# Altium footprint library 全库.PcbLib: 967 footprints (part 59 of 61)
Each footprint in its own frame and in the unit in brackets; x right, y up, seen from the top. Pads: shape width x height; smd on the part's side, far side on the other; paste and mask are expansions set on the pad; w line width, h text height; cw(c..) or ccw(c..) is an arc to the next point about the centre after c.
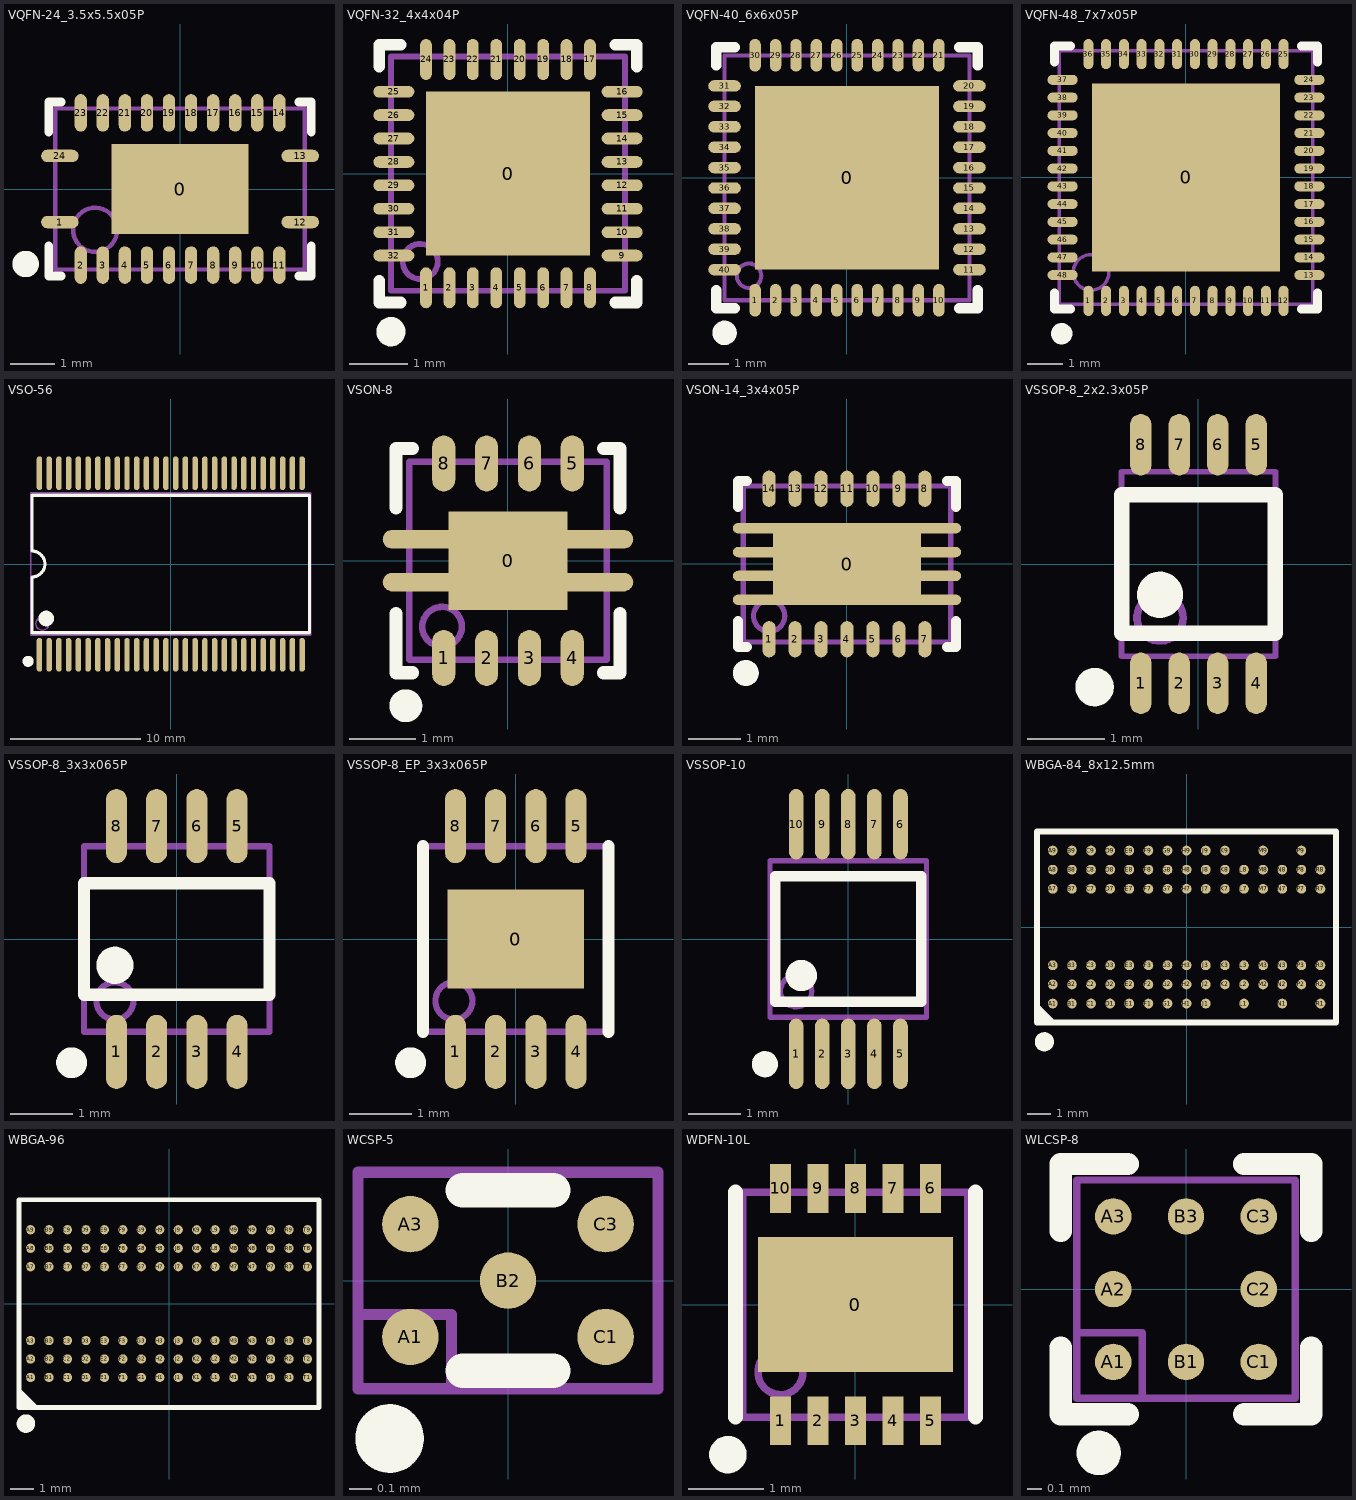
[diagram p58: the footprints below, top view; thin cyan lines are the x and y axes]

## VQFN-24_3.5x5.5x05P [mm]
pads (25):
  rect 3.1x2.05 smd paste-1.025 mask+0.051: 0(0,0)
  oval 0.85x0.28 smd paste-0.025 mask+0.051: 1(-2.725,-0.75) 12(2.725,-0.75) 13(2.725,0.75) 24(-2.725,0.75)
  oval 0.28x0.85 smd paste-0.025 mask+0.051: 2(-2.25,-1.725) 3(-1.75,-1.725) 4(-1.25,-1.725) 5(-0.75,-1.725) 6(-0.25,-1.725) 7(0.25,-1.725) 8(0.75,-1.725) 9(1.25,-1.725) 10(1.75,-1.725) 11(2.25,-1.725) 14(2.25,1.725) 15(1.75,1.725) 16(1.25,1.725) 17(0.75,1.725) 18(0.25,1.725) 19(-0.25,1.725) 20(-0.75,1.725) 21(-1.25,1.725) 22(-1.75,1.725) 23(-2.25,1.725)
Top Overlay:
  circle w0.3: c-3.5,-1.7 r0.15
  lines w0.2: -2.975,-1.29 -2.975,-1.975 -2.7,-1.975 ; -2.975,1.29 -2.975,1.975 -2.7,1.975 ; 2.7,-1.975 2.975,-1.975 2.975,-1.29 ; 2.7,1.975 2.975,1.975 2.975,1.29
Top Paste:
  rectangle: -1.465,-0.975 -0.145,-0.155
  region: 1.475,-0.155 0.155,-0.155 0.155,-0.975 1.475,-0.975
  region: 1.475,0.965 0.155,0.965 0.155,0.145 1.475,0.145
  rectangle: -1.465,0.145 -0.145,0.965
Mechanical 13:
  circle w0.1: c-1.925,-0.925 r0.5
  lines w0.1: -2.825,-1.825 2.825,-1.825 2.825,1.825 -2.825,1.825 -2.825,-1.825

## VQFN-32_4x4x04P [mm]
pads (33):
  rect 2.8x2.8 smd paste-0.025 mask+0.051: 0(0,0)
  oval 0.2x0.7 smd paste-0.025 mask+0.051: 1(-1.4,-1.95) 2(-1,-1.95) 3(-0.6,-1.95) 4(-0.2,-1.95) 5(0.2,-1.95) 6(0.6,-1.95) 7(1,-1.95) 8(1.4,-1.95) 17(1.4,1.95) 18(1,1.95) 19(0.6,1.95) 20(0.2,1.95) 21(-0.2,1.95) 22(-0.6,1.95) 23(-1,1.95) 24(-1.4,1.95)
  oval 0.7x0.2 smd paste-0.025 mask+0.051: 9(1.95,-1.4) 10(1.95,-1) 11(1.95,-0.6) 12(1.95,-0.2) 13(1.95,0.2) 14(1.95,0.6) 15(1.95,1) 16(1.95,1.4) 25(-1.95,1.4) 26(-1.95,1) 27(-1.95,0.6) 28(-1.95,0.2) 29(-1.95,-0.2) 30(-1.95,-0.6) 31(-1.95,-1) 32(-1.95,-1.4)
Top Overlay:
  circle w0.25: c-2,-2.7 r0.125
  lines w0.2: -2.2,-1.83 -2.2,-2.2 -1.83,-2.2 ; -2.2,1.83 -2.2,2.2 -1.83,2.2 ; 1.83,-2.2 2.2,-2.2 2.2,-1.83 ; 1.83,2.2 2.2,2.2 2.2,1.83
Mechanical 13:
  circle w0.1: c-1.5,-1.5 r0.3
  lines w0.1: -2,-2 -2,2 2,2 2,-2 -2,-2

## VQFN-40_6x6x05P [mm]
pads (41):
  rect 4.5x4.5 smd mask+0.051: 0(0,0)
  oval 0.28x0.8 smd mask+0.051: 1(-2.25,-3) 2(-1.75,-3) 3(-1.25,-3) 4(-0.75,-3) 5(-0.25,-3) 6(0.25,-3) 7(0.75,-3) 8(1.25,-3) 9(1.75,-3) 10(2.25,-3) 21(2.25,3) 22(1.75,3) 23(1.25,3) 24(0.75,3) 25(0.25,3) 26(-0.25,3) 27(-0.75,3) 28(-1.25,3) 29(-1.75,3) 30(-2.25,3)
  oval 0.8x0.28 smd mask+0.051: 11(3,-2.25) 12(3,-1.75) 13(3,-1.25) 14(3,-0.75) 15(3,-0.25) 16(3,0.25) 17(3,0.75) 18(3,1.25) 19(3,1.75) 20(3,2.25) 31(-3,2.25) 32(-3,1.75) 33(-3,1.25) 34(-3,0.75) 35(-3,0.25) 36(-3,-0.25) 37(-3,-0.75) 38(-3,-1.25) 39(-3,-1.75) 40(-3,-2.25)
Top Overlay:
  circle w0.3: c-3,-3.8 r0.15
  lines w0.254: -3.2,-2.75 -3.2,-3.2 -2.75,-3.2 ; -3.2,2.75 -3.2,3.2 -2.75,3.2 ; 2.75,-3.2 3.2,-3.2 3.2,-2.75 ; 2.75,3.2 3.2,3.2 3.2,2.75
Mechanical 13:
  circle w0.1: c-2.4,-2.4 r0.3
  lines w0.1: -3,-3 3,-3 3,3 -3,3 -3,-3

## VQFN-48_7x7x05P [mm]
pads (49):
  rect 5.3x5.3 smd paste-2.65 mask+0.051: 0(0,0)
  oval 0.28x0.85 smd paste-0.025 mask+0.051: 1(-2.75,-3.475) 2(-2.25,-3.475) 3(-1.75,-3.475) 4(-1.25,-3.475) 5(-0.75,-3.475) 6(-0.25,-3.475) 7(0.25,-3.475) 8(0.75,-3.475) 9(1.25,-3.475) 10(1.75,-3.475) 11(2.25,-3.475) 12(2.75,-3.475) 25(2.75,3.475) 26(2.25,3.475) 27(1.75,3.475) 28(1.25,3.475) 29(0.75,3.475) 30(0.25,3.475) 31(-0.25,3.475) 32(-0.75,3.475) 33(-1.25,3.475) 34(-1.75,3.475) 35(-2.25,3.475) 36(-2.75,3.475)
  oval 0.85x0.28 smd paste-0.025 mask+0.051: 13(3.475,-2.75) 14(3.475,-2.25) 15(3.475,-1.75) 16(3.475,-1.25) 17(3.475,-0.75) 18(3.475,-0.25) 19(3.475,0.25) 20(3.475,0.75) 21(3.475,1.25) 22(3.475,1.75) 23(3.475,2.25) 24(3.475,2.75) 37(-3.475,2.75) 38(-3.475,2.25) 39(-3.475,1.75) 40(-3.475,1.25) 41(-3.475,0.75) 42(-3.475,0.25) 43(-3.475,-0.25) 44(-3.475,-0.75) 45(-3.475,-1.25) 46(-3.475,-1.75) 47(-3.475,-2.25) 48(-3.475,-2.75)
Top Overlay:
  circle w0.3: c-3.5,-4.4 r0.15
  lines w0.254: -3.7,-3.25 -3.7,-3.7 -3.25,-3.7 ; -3.7,3.25 -3.7,3.7 -3.25,3.7 ; 3.25,-3.7 3.7,-3.7 3.7,-3.25 ; 3.25,3.7 3.7,3.7 3.7,3.25
Top Paste:
  region: 0.1,-0.1 0.1,-1.2 1.2,-1.2 1.2,-0.1
  region: 1.425,-0.075 1.425,-1.225 2.525,-1.225 2.525,-0.075
  region: 0.075,-1.425 0.075,-2.525 1.225,-2.525 1.225,-1.425
  region: 1.4,-1.4 1.4,-2.55 2.55,-2.55 2.55,-1.4
  region: -1.2,-0.1 -1.2,-1.2 -0.1,-1.2 -0.1,-0.1
  region: -2.525,-0.075 -2.525,-1.225 -1.425,-1.225 -1.425,-0.075
  region: -1.225,-1.425 -1.225,-2.525 -0.075,-2.525 -0.075,-1.425
  region: -2.55,-1.4 -2.55,-2.55 -1.4,-2.55 -1.4,-1.4
  region: -0.1,1.2 -1.2,1.2 -1.2,0.1 -0.1,0.1
  region: -0.1,2.55 -1.2,2.55 -1.2,1.4 -0.1,1.4
  region: -1.4,1.2 -2.55,1.2 -2.55,0.1 -1.4,0.1
  region: -1.4,2.55 -2.55,2.55 -2.55,1.4 -1.4,1.4
  rectangle: 1.4,1.4 2.55,2.55
  rectangle: 1.4,0.1 2.55,1.2
  rectangle: 0.1,1.4 1.2,2.55
  rectangle: 0.1,0.1 1.2,1.2
Mechanical 13:
  circle w0.1: c-2.675,-2.675 r0.5
  lines w0.1: -3.575,-3.575 3.575,-3.575 3.575,3.575 -3.575,3.575 -3.575,-3.575

## VSO-56 [mm]
pads (56):
  oval 0.42x2.6 smd: 1(-10.125,-7) 2(-9.375,-7) 3(-8.625,-7) 4(-7.875,-7) 5(-7.125,-7) 6(-6.375,-7) 7(-5.625,-7) 8(-4.875,-7) 9(-4.125,-7) 10(-3.375,-7) 11(-2.625,-7) 12(-1.875,-7) 13(-1.125,-7) 14(-0.375,-7) 15(0.375,-7) 16(1.125,-7) 17(1.875,-7) 18(2.625,-7) 19(3.375,-7) 20(4.125,-7) 21(4.875,-7) 22(5.625,-7) 23(6.375,-7) 24(7.125,-7) 25(7.875,-7) 26(8.625,-7) 27(9.375,-7) 28(10.125,-7) 29(10.125,7) 30(9.375,7) 31(8.625,7) 32(7.875,7) 33(7.125,7) 34(6.375,7) 35(5.625,7) 36(4.875,7) 37(4.125,7) 38(3.375,7) 39(2.625,7) 40(1.875,7) 41(1.125,7) 42(0.375,7) 43(-0.375,7) 44(-1.125,7) 45(-1.875,7) 46(-2.625,7) 47(-3.375,7) 48(-4.125,7) 49(-4.875,7) 50(-5.625,7) 51(-6.375,7) 52(-7.125,7) 53(-7.875,7) 54(-8.625,7) 55(-9.375,7) 56(-10.125,7)
Top Overlay:
  circle w0.6: c-9.6,-4.2 r0.3
  circle w0.45: c-11,-7.5 r0.2
  lines w0.254: -10.7,-5.3 10.7,-5.3 10.7,5.3 -10.7,5.3 -10.7,1 cw(c-10.7,0) -10.7,-1 -10.7,-5.3
Mechanical 13:
  circle w0.1: c-9.9,-4.6 r0.5
  lines w0.1: -10.8,-5.5 -10.8,5.5 10.8,5.5 10.8,-5.5 -10.8,-5.5

## VSON-8 [mm]
pads (11):
  rect 1.8x1.5 smd: 0(0,0)
  oval 0.35x0.85 smd: 1(-0.975,-1.475) 2(-0.325,-1.475) 3(0.325,-1.475) 4(0.975,-1.475) 5(0.975,1.475) 6(0.325,1.475) 7(-0.325,1.475) 8(-0.975,1.475)
  oval 3.8x0.28 smd: ""(0,-0.325) ""(0,0.325)
Top Overlay:
  circle w0.25: c-1.55,-2.2 r0.125
  lines w0.2: -1.7,-0.8 -1.7,-1.7 -1.45,-1.7 ; -1.7,0.8 -1.7,1.7 -1.45,1.7 ; 1.45,-1.7 1.7,-1.7 1.7,-0.8 ; 1.45,1.7 1.7,1.7 1.7,0.8
Mechanical 13:
  circle w0.1: c-1,-1 r0.3
  lines w0.1: -1.5,-1.5 1.5,-1.5 1.5,1.5 -1.5,1.5 -1.5,-1.5

## VSON-14_3x4x05P [mm]
pads (19):
  rect 2.85x1.58 smd mask+0.051: 0(0,0)
  oval 0.25x0.7 smd mask+0.051: 1(-1.5,-1.45) 2(-1,-1.45) 3(-0.5,-1.45) 4(0,-1.45) 5(0.5,-1.45) 6(1,-1.45) 7(1.5,-1.45) 8(1.5,1.45) 9(1,1.45) 10(0.5,1.45) 11(0,1.45) 12(-0.5,1.45) 13(-1,1.45) 14(-1.5,1.45)
  oval 4.4x0.2 smd mask+0.051: ""(0,-0.69) ""(0,-0.23) ""(0,0.23) ""(0,0.69)
Top Overlay:
  circle w0.25: c-1.95,-2.1 r0.125
  lines w0.2: -2.1,-1.1 -2.1,-1.6 -1.93,-1.6 ; -2.1,1.1 -2.1,1.6 -1.93,1.6 ; 1.93,-1.6 2.1,-1.6 2.1,-1.1 ; 1.93,1.6 2.1,1.6 2.1,1.1
Mechanical 13:
  circle w0.1: c-1.5,-1 r0.3
  lines w0.1: -2,-1.5 2,-1.5 2,1.5 -2,1.5 -2,-1.5

## VSSOP-8_2x2.3x05P [mm]
pads (8):
  oval 0.28x0.8 smd mask+0.051: 1(-0.75,-1.55) 2(-0.25,-1.55) 3(0.25,-1.55) 4(0.75,-1.55) 5(0.75,1.55) 6(0.25,1.55) 7(-0.25,1.55) 8(-0.75,1.55)
Top Overlay:
  circle w0.25: c-1.35,-1.6 r0.125
  circle w0.35: c-0.5,-0.4 r0.125
  lines w0.2: -1,-0.9 1,-0.9 1,0.9 -1,0.9 -1,-0.9
Mechanical 13:
  circle w0.1: c-0.5,-0.7 r0.3
  lines w0.076: -1,-1.2 1,-1.2 1,1.2 -1,1.2 -1,-1.2

## VSSOP-8_3x3x065P [mm]
pads (8):
  oval 0.34x1.2 smd: 1(-0.975,-1.825) 2(-0.325,-1.825) 3(0.325,-1.825) 4(0.975,-1.825) 5(0.975,1.825) 6(0.325,1.825) 7(-0.325,1.825) 8(-0.975,1.825)
Top Overlay:
  circle w0.35: c-1,-0.425 r0.125
  circle w0.25: c-1.7,-2 r0.125
  lines w0.2: -1.5,-0.9 1.5,-0.9 1.5,0.9 -1.5,0.9 -1.5,-0.9
Mechanical 13:
  circle w0.1: c-1,-1 r0.3
  lines w0.1: -1.5,-1.5 1.5,-1.5 1.5,1.5 -1.5,1.5 -1.5,-1.5

## VSSOP-8_EP_3x3x065P [mm]
pads (9):
  rect 2.2x1.6 smd mask+0.051: 0(0,0)
  oval 0.34x1.2 smd: 1(-0.975,-1.825) 2(-0.325,-1.825) 3(0.325,-1.825) 4(0.975,-1.825) 5(0.975,1.825) 6(0.325,1.825) 7(-0.325,1.825) 8(-0.975,1.825)
Top Overlay:
  circle w0.25: c-1.7,-2 r0.125
  lines w0.2: -1.5,-1.5 -1.5,1.5 ; 1.5,-1.5 1.5,1.5
Mechanical 13:
  circle w0.1: c-1,-1 r0.3
  lines w0.1: -1.5,-1.5 -1.5,1.5 1.5,1.5 1.5,-1.5 -1.5,-1.5

## VSSOP-10 [mm]
pads (10):
  oval 0.28x1.35 smd mask+0.051: 1(-1,-2.2) 2(-0.5,-2.2) 3(0,-2.2) 4(0.5,-2.2) 5(1,-2.2) 6(1,2.2) 7(0.5,2.2) 8(0,2.2) 9(-0.5,2.2) 10(-1,2.2)
Top Overlay:
  circle w0.25: c-1.6,-2.4 r0.125
  circle w0.35: c-0.9,-0.7 r0.125
  lines w0.2: -1.4,-1.2 -1.4,1.2 1.4,1.2 1.4,-1.2 -1.4,-1.2
Mechanical 13:
  circle w0.1: c-1,-1 r0.3
  lines w0.1: -1.5,-1.5 -1.5,1.5 1.5,1.5 1.5,-1.5 -1.5,-1.5

## WBGA-84_8x12.5mm [mm]
pads (84):
  round 0.41 smd mask+0.051: A1(-5.6,-3.2) A2(-5.6,-2.4) A3(-5.6,-1.6) A7(-5.6,1.6) A8(-5.6,2.4) A9(-5.6,3.2) B1(-4.8,-3.2) B2(-4.8,-2.4) B3(-4.8,-1.6) B7(-4.8,1.6) B8(-4.8,2.4) B9(-4.8,3.2) C1(-4,-3.2) C2(-4,-2.4) C3(-4,-1.6) C7(-4,1.6) C8(-4,2.4) C9(-4,3.2) D1(-3.2,-3.2) D2(-3.2,-2.4) D3(-3.2,-1.6) D7(-3.2,1.6) D8(-3.2,2.4) D9(-3.2,3.2) E1(-2.4,-3.2) E2(-2.4,-2.4) E3(-2.4,-1.6) E7(-2.4,1.6) E8(-2.4,2.4) E9(-2.4,3.2) F1(-1.6,-3.2) F2(-1.6,-2.4) F3(-1.6,-1.6) F7(-1.6,1.6) F8(-1.6,2.4) F9(-1.6,3.2) G1(-0.8,-3.2) G2(-0.8,-2.4) G3(-0.8,-1.6) G7(-0.8,1.6) G8(-0.8,2.4) G9(-0.8,3.2) H1(0,-3.2) H2(0,-2.4) H3(0,-1.6) H7(0,1.6) H8(0,2.4) H9(0,3.2) J1(0.8,-3.2) J2(0.8,-2.4) J3(0.8,-1.6) J7(0.8,1.6) J8(0.8,2.4) J9(0.8,3.2) K2(1.6,-2.4) K3(1.6,-1.6) K7(1.6,1.6) K8(1.6,2.4) K9(1.6,3.2) L1(2.4,-3.2) L2(2.4,-2.4) L3(2.4,-1.6) L7(2.4,1.6) L8(2.4,2.4) M2(3.2,-2.4) M3(3.2,-1.6) M7(3.2,1.6) M8(3.2,2.4) M9(3.2,3.2) N1(4,-3.2) N2(4,-2.4) N3(4,-1.6) N7(4,1.6) N8(4,2.4) P2(4.8,-2.4) P3(4.8,-1.6) P7(4.8,1.6) P8(4.8,2.4) P9(4.8,3.2) R1(5.6,-3.2) R2(5.6,-2.4) R3(5.6,-1.6) R7(5.6,1.6) R8(5.6,2.4)
Top Overlay:
  circle w0.4: c-5.95,-4.8 r0.2
  region: -6.3,-4.07 -5.369,-4.07 -6.296,-3.143 -6.3,-3.143
  lines w0.254: -6.25,-4 6.25,-4 6.25,4 -6.25,4 -6.25,-4

## WBGA-96 [mm]
pads (96):
  round 0.4 smd mask+0.051: A1(-6,-3.2) A2(-6,-2.4) A3(-6,-1.6) A7(-6,1.6) A8(-6,2.4) A9(-6,3.2) B1(-5.2,-3.2) B2(-5.2,-2.4) B3(-5.2,-1.6) B7(-5.2,1.6) B8(-5.2,2.4) B9(-5.2,3.2) C1(-4.4,-3.2) C2(-4.4,-2.4) C3(-4.4,-1.6) C7(-4.4,1.6) C8(-4.4,2.4) C9(-4.4,3.2) D1(-3.6,-3.2) D2(-3.6,-2.4) D3(-3.6,-1.6) D7(-3.6,1.6) D8(-3.6,2.4) D9(-3.6,3.2) E1(-2.8,-3.2) E2(-2.8,-2.4) E3(-2.8,-1.6) E7(-2.8,1.6) E8(-2.8,2.4) E9(-2.8,3.2) F1(-2,-3.2) F2(-2,-2.4) F3(-2,-1.6) F7(-2,1.6) F8(-2,2.4) F9(-2,3.2) G1(-1.2,-3.2) G2(-1.2,-2.4) G3(-1.2,-1.6) G7(-1.2,1.6) G8(-1.2,2.4) G9(-1.2,3.2) H1(-0.4,-3.2) H2(-0.4,-2.4) H3(-0.4,-1.6) H7(-0.4,1.6) H8(-0.4,2.4) H9(-0.4,3.2) J1(0.4,-3.2) J2(0.4,-2.4) J3(0.4,-1.6) J7(0.4,1.6) J8(0.4,2.4) J9(0.4,3.2) K1(1.2,-3.2) K2(1.2,-2.4) K3(1.2,-1.6) K7(1.2,1.6) K8(1.2,2.4) K9(1.2,3.2) L1(2,-3.2) L2(2,-2.4) L3(2,-1.6) L7(2,1.6) L8(2,2.4) L9(2,3.2) M1(2.8,-3.2) M2(2.8,-2.4) M3(2.8,-1.6) M7(2.8,1.6) M8(2.8,2.4) M9(2.8,3.2) N1(3.6,-3.2) N2(3.6,-2.4) N3(3.6,-1.6) N7(3.6,1.6) N8(3.6,2.4) N9(3.6,3.2) P1(4.4,-3.2) P2(4.4,-2.4) P3(4.4,-1.6) P7(4.4,1.6) P8(4.4,2.4) P9(4.4,3.2) R1(5.2,-3.2) R2(5.2,-2.4) R3(5.2,-1.6) R7(5.2,1.6) R8(5.2,2.4) R9(5.2,3.2) T1(6,-3.2) T2(6,-2.4) T3(6,-1.6) T7(6,1.6) T8(6,2.4) T9(6,3.2)
Top Overlay:
  circle w0.4: c-6.2,-5.2 r0.2
  region: -6.5,-4.563 -5.569,-4.563 -6.496,-3.637 -6.5,-3.637
  lines w0.2: -6.5,-4.5 -6.5,4.5 6.5,4.5 6.5,-4.5 -6.5,-4.5

## WCSP-5 [mm]
pads (5):
  round 0.25 smd mask+0.051: A1(-0.433,-0.25) A3(-0.433,0.25) B2(0,0) C1(0.433,-0.25) C3(0.433,0.25)
Top Overlay:
  circle w0.152: c-0.525,-0.7 r0.076
  lines w0.152: -0.2,-0.4 0.2,-0.4 ; -0.2,0.4 0.2,0.4
Mechanical 13:
  lines w0.05: -0.665,-0.15 -0.25,-0.15 -0.25,-0.48 ; -0.665,-0.48 0.665,-0.48 0.665,0.48 -0.665,0.48 -0.665,-0.48

## WDFN-10L [mm]
pads (11):
  rect 2.6x1.8 smd mask+0.051: 0(0,0)
  rect 0.28x0.65 smd mask+0.051: 1(-1,-1.55) 2(-0.5,-1.55) 3(0,-1.55) 4(0.5,-1.55) 5(1,-1.55) 6(1,1.55) 7(0.5,1.55) 8(0,1.55) 9(-0.5,1.55) 10(-1,1.55)
Top Overlay:
  circle w0.25: c-1.7,-2 r0.125
  lines w0.2: -1.6,-1.5 -1.6,1.5 ; 1.6,-1.5 1.6,1.5
Mechanical 13:
  circle w0.1: c-1,-0.9 r0.3
  lines w0.1: -1.5,-1.5 1.5,-1.5 1.5,1.5 -1.5,1.5 -1.5,-1.5

## WLCSP-8 [mm]
pads (8):
  round 0.25 smd mask+0.051: A1(-0.5,-0.5) A2(-0.5,0) A3(-0.5,0.5) B1(0,-0.5) B3(0,0.5) C1(0.5,-0.5) C2(0.5,0) C3(0.5,0.5)
Top Overlay:
  circle w0.152: c-0.6,-1.125 r0.076
  lines w0.152: -0.86,-0.4 -0.86,-0.86 -0.4,-0.86 ; -0.86,0.4 -0.86,0.86 -0.4,0.86 ; 0.4,-0.86 0.86,-0.86 0.86,-0.4 ; 0.4,0.86 0.86,0.86 0.86,0.4
Mechanical 13:
  lines w0.05: -0.75,-0.3 -0.3,-0.3 -0.3,-0.75 ; -0.75,-0.75 0.75,-0.75 0.75,0.75 -0.75,0.75 -0.75,-0.75